# Altium footprint library con-molex.PCBLIB: 369 footprints (part 22 of 26)
Each footprint in its own frame and in the unit in brackets; x right, y up, seen from the top. Pads: shape width x height; smd on the part's side, far side on the other; paste and mask are expansions set on the pad; w line width, h text height; cw(c..) or ccw(c..) is an arc to the next point about the centre after c.
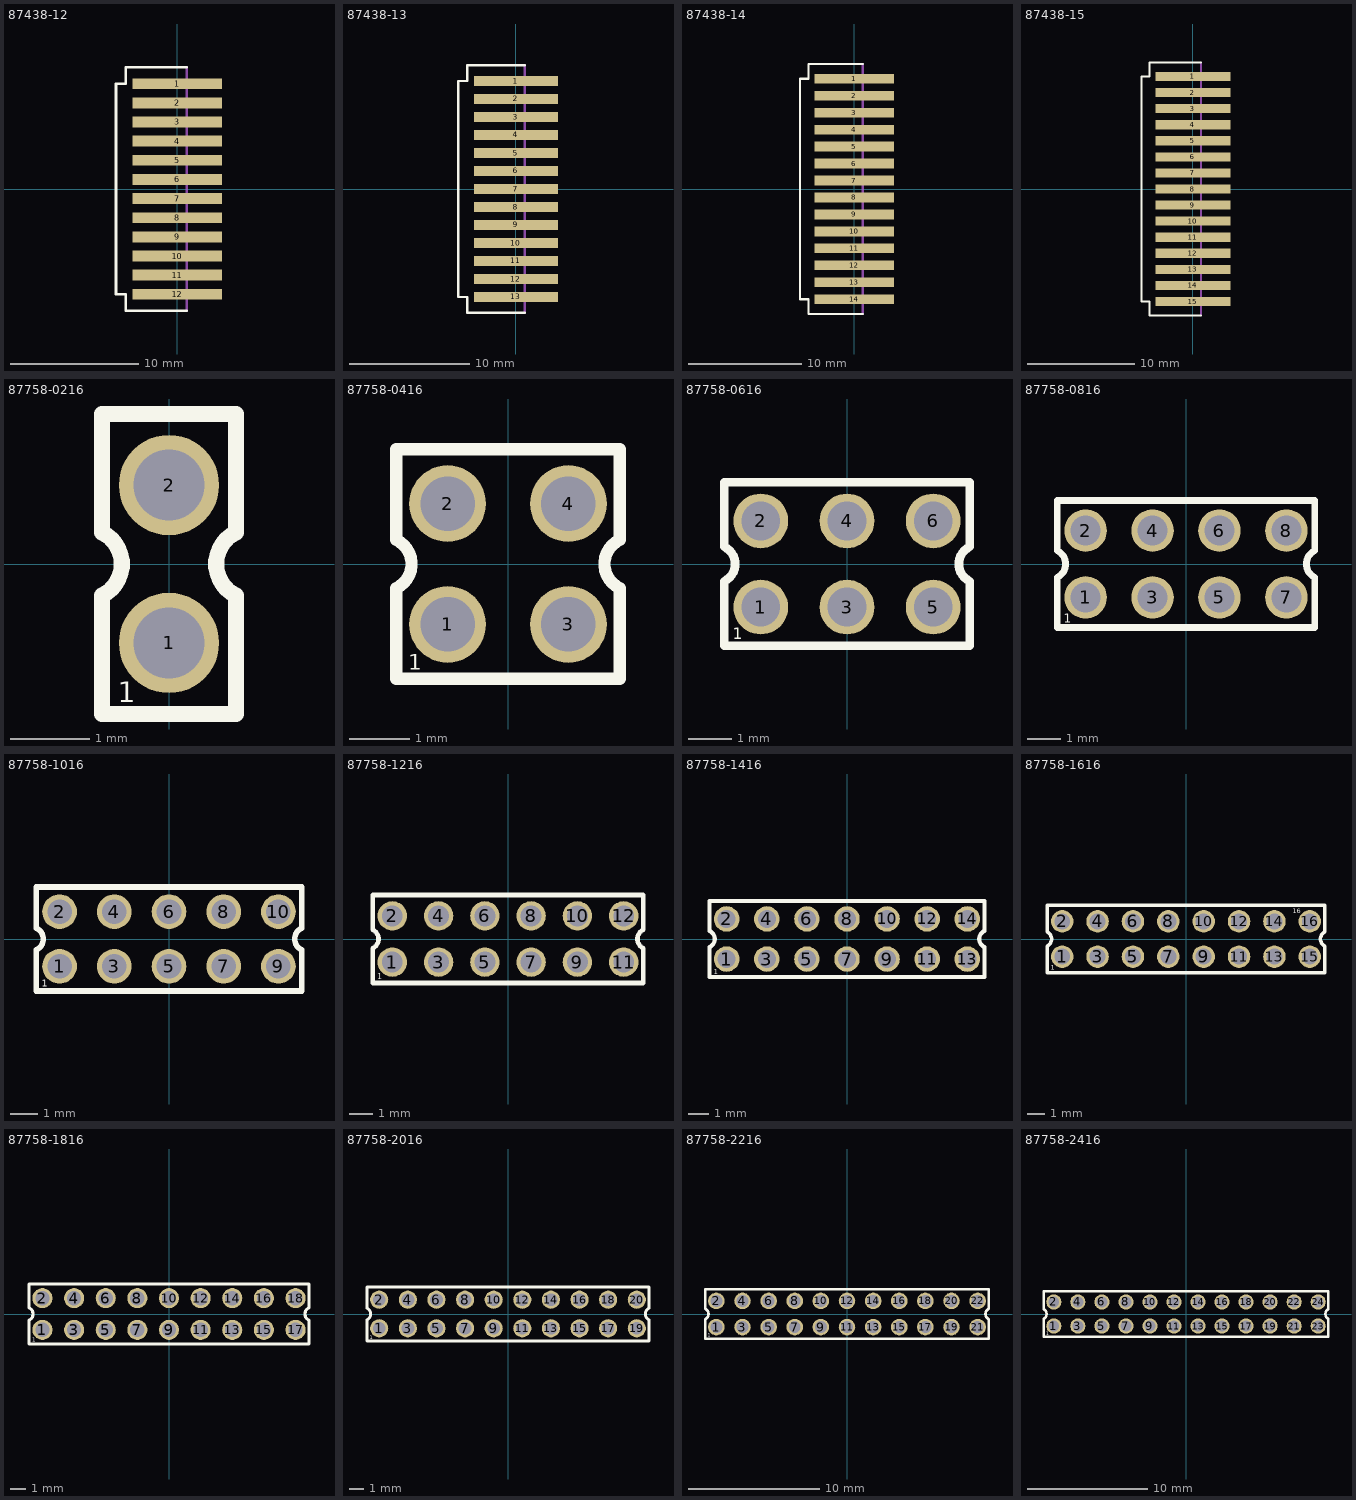
[diagram p21: the footprints below, top view; thin cyan lines are the x and y axes]

## 87438-12 [mm]
pads (12):
  rect 7x0.85 smd: 1(0,8.25) 2(0,6.75) 3(0,5.25) 4(0,3.75) 5(0,2.25) 6(0,0.75) 7(0,-0.75) 8(0,-2.25) 9(0,-3.75) 10(0,-5.25) 11(0,-6.75) 12(0,-8.25)
Top Overlay:
  lines w0.203: 0.75,-9.55 -4.05,-9.55 -4.05,-8.25 -4.8,-8.25 -4.8,8.25 -4.05,8.25 -4.05,9.55 0.75,9.55
Mechanical 16:
  rectangle: 0.8,8.025 2.85,8.475
  rectangle: 0.8,6.525 2.85,6.975
  rectangle: 0.8,5.025 2.85,5.475
  rectangle: 0.8,3.525 2.85,3.975
  rectangle: 0.8,2.025 2.85,2.475
  rectangle: 0.8,0.525 2.85,0.975
  rectangle: 0.8,-0.975 2.85,-0.525
  rectangle: 0.8,-2.475 2.85,-2.025
  rectangle: 0.8,-3.975 2.85,-3.525
  rectangle: 0.8,-5.475 2.85,-5.025
  rectangle: 0.8,-6.975 2.85,-6.525
  rectangle: 0.8,-8.475 2.85,-8.025
  lines w0.203: 0.75,-9.55 0.75,9.55

## 87438-13 [mm]
pads (13):
  rect 7x0.85 smd: 1(0,9) 2(0,7.5) 3(0,6) 4(0,4.5) 5(0,3) 6(0,1.5) 7(0,0) 8(0,-1.5) 9(0,-3) 10(0,-4.5) 11(0,-6) 12(0,-7.5) 13(0,-9)
Top Overlay:
  lines w0.203: 0.75,-10.3 -4.05,-10.3 -4.05,-9 -4.8,-9 -4.8,9 -4.05,9 -4.05,10.3 0.75,10.3
Mechanical 16:
  rectangle: 0.8,8.775 2.85,9.225
  rectangle: 0.8,7.275 2.85,7.725
  rectangle: 0.8,5.775 2.85,6.225
  rectangle: 0.8,4.275 2.85,4.725
  rectangle: 0.8,2.775 2.85,3.225
  rectangle: 0.8,1.275 2.85,1.725
  rectangle: 0.8,-0.225 2.85,0.225
  rectangle: 0.8,-1.725 2.85,-1.275
  rectangle: 0.8,-3.225 2.85,-2.775
  rectangle: 0.8,-4.725 2.85,-4.275
  rectangle: 0.8,-6.225 2.85,-5.775
  rectangle: 0.8,-7.725 2.85,-7.275
  rectangle: 0.8,-9.225 2.85,-8.775
  lines w0.203: 0.75,-10.3 0.75,10.3

## 87438-14 [mm]
pads (14):
  rect 7x0.85 smd: 1(0,9.75) 2(0,8.25) 3(0,6.75) 4(0,5.25) 5(0,3.75) 6(0,2.25) 7(0,0.75) 8(0,-0.75) 9(0,-2.25) 10(0,-3.75) 11(0,-5.25) 12(0,-6.75) 13(0,-8.25) 14(0,-9.75)
Top Overlay:
  lines w0.203: 0.75,-11.05 -4.05,-11.05 -4.05,-9.75 -4.8,-9.75 -4.8,9.75 -4.05,9.75 -4.05,11.05 0.75,11.05
Mechanical 16:
  rectangle: 0.8,9.525 2.85,9.975
  rectangle: 0.8,8.025 2.85,8.475
  rectangle: 0.8,6.525 2.85,6.975
  rectangle: 0.8,5.025 2.85,5.475
  rectangle: 0.8,3.525 2.85,3.975
  rectangle: 0.8,2.025 2.85,2.475
  rectangle: 0.8,0.525 2.85,0.975
  rectangle: 0.8,-0.975 2.85,-0.525
  rectangle: 0.8,-2.475 2.85,-2.025
  rectangle: 0.8,-3.975 2.85,-3.525
  rectangle: 0.8,-5.475 2.85,-5.025
  rectangle: 0.8,-6.975 2.85,-6.525
  rectangle: 0.8,-8.475 2.85,-8.025
  rectangle: 0.8,-9.975 2.85,-9.525
  lines w0.203: 0.75,-11.05 0.75,11.05

## 87438-15 [mm]
pads (15):
  rect 7x0.85 smd: 1(0,10.5) 2(0,9) 3(0,7.5) 4(0,6) 5(0,4.5) 6(0,3) 7(0,1.5) 8(0,0) 9(0,-1.5) 10(0,-3) 11(0,-4.5) 12(0,-6) 13(0,-7.5) 14(0,-9) 15(0,-10.5)
Top Overlay:
  lines w0.203: 0.75,-11.8 -4.05,-11.8 -4.05,-10.5 -4.8,-10.5 -4.8,10.5 -4.05,10.5 -4.05,11.8 0.75,11.8
Mechanical 16:
  rectangle: 0.8,10.275 2.85,10.725
  rectangle: 0.8,8.775 2.85,9.225
  rectangle: 0.8,7.275 2.85,7.725
  rectangle: 0.8,5.775 2.85,6.225
  rectangle: 0.8,4.275 2.85,4.725
  rectangle: 0.8,2.775 2.85,3.225
  rectangle: 0.8,1.275 2.85,1.725
  rectangle: 0.8,-0.225 2.85,0.225
  rectangle: 0.8,-1.725 2.85,-1.275
  rectangle: 0.8,-3.225 2.85,-2.775
  rectangle: 0.8,-4.725 2.85,-4.275
  rectangle: 0.8,-6.225 2.85,-5.775
  rectangle: 0.8,-7.725 2.85,-7.275
  rectangle: 0.8,-9.225 2.85,-8.775
  rectangle: 0.8,-10.725 2.85,-10.275
  lines w0.203: 0.75,-11.8 0.75,11.8

## 87758-0216 [mm]
pads (2):
  round 1.27 hole 0.9: 1(0,-1) 2(0,1)
Top Overlay:
  lines w0.203: -0.85,-1.9 0.85,-1.9 0.85,-0.4 cw(c1.04,0) 0.85,0.4 0.85,1.9 -0.85,1.9 -0.85,0.4 cw(c-1.04,0) -0.85,-0.4 -0.85,-1.9
  text "1" at -0.65,-1.75 h0.26
Mechanical 16:
  rectangle: -0.25,-1.25 0.25,-0.75
  rectangle: -0.25,0.75 0.25,1.25

## 87758-0416 [mm]
pads (4):
  round 1.27 hole 0.9: 1(-1,-1) 2(-1,1) 3(1,-1) 4(1,1)
Top Overlay:
  lines w0.203: -1.85,-1.9 1.85,-1.9 1.85,-0.4 cw(c2.04,0) 1.85,0.4 1.85,1.9 -1.85,1.9 -1.85,0.4 cw(c-2.04,0) -1.85,-0.4 -1.85,-1.9
  text "1" at -1.65,-1.75 h0.26
Mechanical 16:
  rectangle: -1.25,-1.25 -0.75,-0.75
  rectangle: -1.25,0.75 -0.75,1.25
  rectangle: 0.75,-1.25 1.25,-0.75
  rectangle: 0.75,0.75 1.25,1.25

## 87758-0616 [mm]
pads (6):
  round 1.27 hole 0.9: 1(-2,-1) 2(-2,1) 3(0,-1) 4(0,1) 5(2,-1) 6(2,1)
Top Overlay:
  lines w0.203: -2.85,-1.9 2.85,-1.9 2.85,-0.4 cw(c3.04,0) 2.85,0.4 2.85,1.9 -2.85,1.9 -2.85,0.4 cw(c-3.04,0) -2.85,-0.4 -2.85,-1.9
  text "1" at -2.65,-1.75 h0.26
Mechanical 16:
  rectangle: -2.25,-1.25 -1.75,-0.75
  rectangle: -2.25,0.75 -1.75,1.25
  rectangle: -0.25,-1.25 0.25,-0.75
  rectangle: -0.25,0.75 0.25,1.25
  rectangle: 1.75,-1.25 2.25,-0.75
  rectangle: 1.75,0.75 2.25,1.25

## 87758-0816 [mm]
pads (8):
  round 1.27 hole 0.9: 1(-3,-1) 2(-3,1) 3(-1,-1) 4(-1,1) 5(1,-1) 6(1,1) 7(3,-1) 8(3,1)
Top Overlay:
  lines w0.203: -3.85,-1.9 3.85,-1.9 3.85,-0.4 cw(c4.04,0) 3.85,0.4 3.85,1.9 -3.85,1.9 -3.85,0.4 cw(c-4.04,0) -3.85,-0.4 -3.85,-1.9
  text "1" at -3.65,-1.75 h0.26
Mechanical 16:
  rectangle: -3.25,-1.25 -2.75,-0.75
  rectangle: -3.25,0.75 -2.75,1.25
  rectangle: -1.25,-1.25 -0.75,-0.75
  rectangle: -1.25,0.75 -0.75,1.25
  rectangle: 0.75,-1.25 1.25,-0.75
  rectangle: 0.75,0.75 1.25,1.25
  rectangle: 2.75,-1.25 3.25,-0.75
  rectangle: 2.75,0.75 3.25,1.25

## 87758-1016 [mm]
pads (10):
  round 1.27 hole 0.9: 1(-4,-1) 2(-4,1) 3(-2,-1) 4(-2,1) 5(0,-1) 6(0,1) 7(2,-1) 8(2,1) 9(4,-1) 10(4,1)
Top Overlay:
  lines w0.203: -4.85,-1.9 4.85,-1.9 4.85,-0.4 cw(c5.04,0) 4.85,0.4 4.85,1.9 -4.85,1.9 -4.85,0.4 cw(c-5.04,0) -4.85,-0.4 -4.85,-1.9
  text "1" at -4.65,-1.75 h0.26
Mechanical 16:
  rectangle: -4.25,-1.25 -3.75,-0.75
  rectangle: -4.25,0.75 -3.75,1.25
  rectangle: -2.25,-1.25 -1.75,-0.75
  rectangle: -2.25,0.75 -1.75,1.25
  rectangle: -0.25,-1.25 0.25,-0.75
  rectangle: -0.25,0.75 0.25,1.25
  rectangle: 1.75,-1.25 2.25,-0.75
  rectangle: 1.75,0.75 2.25,1.25
  rectangle: 3.75,-1.25 4.25,-0.75
  rectangle: 3.75,0.75 4.25,1.25

## 87758-1216 [mm]
pads (12):
  round 1.27 hole 0.9: 1(-5,-1) 2(-5,1) 3(-3,-1) 4(-3,1) 5(-1,-1) 6(-1,1) 7(1,-1) 8(1,1) 9(3,-1) 10(3,1) 11(5,-1) 12(5,1)
Top Overlay:
  lines w0.203: -5.85,-1.9 5.85,-1.9 5.85,-0.4 cw(c6.04,0) 5.85,0.4 5.85,1.9 -5.85,1.9 -5.85,0.4 cw(c-6.04,0) -5.85,-0.4 -5.85,-1.9
  text "1" at -5.65,-1.75 h0.26
Mechanical 16:
  rectangle: -5.25,-1.25 -4.75,-0.75
  rectangle: -5.25,0.75 -4.75,1.25
  rectangle: -3.25,-1.25 -2.75,-0.75
  rectangle: -3.25,0.75 -2.75,1.25
  rectangle: -1.25,-1.25 -0.75,-0.75
  rectangle: -1.25,0.75 -0.75,1.25
  rectangle: 0.75,-1.25 1.25,-0.75
  rectangle: 0.75,0.75 1.25,1.25
  rectangle: 2.75,-1.25 3.25,-0.75
  rectangle: 2.75,0.75 3.25,1.25
  rectangle: 4.75,-1.25 5.25,-0.75
  rectangle: 4.75,0.75 5.25,1.25

## 87758-1416 [mm]
pads (14):
  round 1.27 hole 0.9: 1(-6,-1) 2(-6,1) 3(-4,-1) 4(-4,1) 5(-2,-1) 6(-2,1) 7(0,-1) 8(0,1) 9(2,-1) 10(2,1) 11(4,-1) 12(4,1) 13(6,-1) 14(6,1)
Top Overlay:
  lines w0.203: -6.85,-1.9 6.85,-1.9 6.85,-0.4 cw(c7.04,0) 6.85,0.4 6.85,1.9 -6.85,1.9 -6.85,0.4 cw(c-7.04,0) -6.85,-0.4 -6.85,-1.9
  text "1" at -6.65,-1.75 h0.26
Mechanical 16:
  rectangle: -6.25,-1.25 -5.75,-0.75
  rectangle: -6.25,0.75 -5.75,1.25
  rectangle: -4.25,-1.25 -3.75,-0.75
  rectangle: -4.25,0.75 -3.75,1.25
  rectangle: -2.25,-1.25 -1.75,-0.75
  rectangle: -2.25,0.75 -1.75,1.25
  rectangle: -0.25,-1.25 0.25,-0.75
  rectangle: -0.25,0.75 0.25,1.25
  rectangle: 1.75,-1.25 2.25,-0.75
  rectangle: 1.75,0.75 2.25,1.25
  rectangle: 3.75,-1.25 4.25,-0.75
  rectangle: 3.75,0.75 4.25,1.25
  rectangle: 5.75,-1.25 6.25,-0.75
  rectangle: 5.75,0.75 6.25,1.25

## 87758-1616 [mm]
pads (16):
  round 1.27 hole 0.9: 1(-7,-1) 2(-7,1) 3(-5,-1) 4(-5,1) 5(-3,-1) 6(-3,1) 7(-1,-1) 8(-1,1) 9(1,-1) 10(1,1) 11(3,-1) 12(3,1) 13(5,-1) 14(5,1) 15(7,-1) 16(7,1)
Top Overlay:
  lines w0.203: -7.85,-1.9 7.85,-1.9 7.85,-0.4 cw(c8.04,0) 7.85,0.4 7.85,1.9 -7.85,1.9 -7.85,0.4 cw(c-8.04,0) -7.85,-0.4 -7.85,-1.9
  text "1" at -7.65,-1.75 h0.26
  text "16" at 6.025,1.45 h0.26
Mechanical 16:
  rectangle: -7.25,-1.25 -6.75,-0.75
  rectangle: -7.25,0.75 -6.75,1.25
  rectangle: -5.25,-1.25 -4.75,-0.75
  rectangle: -5.25,0.75 -4.75,1.25
  rectangle: -3.25,-1.25 -2.75,-0.75
  rectangle: -3.25,0.75 -2.75,1.25
  rectangle: -1.25,-1.25 -0.75,-0.75
  rectangle: -1.25,0.75 -0.75,1.25
  rectangle: 0.75,-1.25 1.25,-0.75
  rectangle: 0.75,0.75 1.25,1.25
  rectangle: 2.75,-1.25 3.25,-0.75
  rectangle: 2.75,0.75 3.25,1.25
  rectangle: 4.75,-1.25 5.25,-0.75
  rectangle: 4.75,0.75 5.25,1.25
  rectangle: 6.75,-1.25 7.25,-0.75
  rectangle: 6.75,0.75 7.25,1.25

## 87758-1816 [mm]
pads (18):
  round 1.27 hole 0.9: 1(-8,-1) 2(-8,1) 3(-6,-1) 4(-6,1) 5(-4,-1) 6(-4,1) 7(-2,-1) 8(-2,1) 9(0,-1) 10(0,1) 11(2,-1) 12(2,1) 13(4,-1) 14(4,1) 15(6,-1) 16(6,1) 17(8,-1) 18(8,1)
Top Overlay:
  lines w0.203: -8.85,-1.9 8.85,-1.9 8.85,-0.4 cw(c9.04,0) 8.85,0.4 8.85,1.9 -8.85,1.9 -8.85,0.4 cw(c-9.04,0) -8.85,-0.4 -8.85,-1.9
  text "1" at -8.65,-1.75 h0.26
Mechanical 16:
  rectangle: -8.25,-1.25 -7.75,-0.75
  rectangle: -8.25,0.75 -7.75,1.25
  rectangle: -6.25,-1.25 -5.75,-0.75
  rectangle: -6.25,0.75 -5.75,1.25
  rectangle: -4.25,-1.25 -3.75,-0.75
  rectangle: -4.25,0.75 -3.75,1.25
  rectangle: -2.25,-1.25 -1.75,-0.75
  rectangle: -2.25,0.75 -1.75,1.25
  rectangle: -0.25,-1.25 0.25,-0.75
  rectangle: -0.25,0.75 0.25,1.25
  rectangle: 1.75,-1.25 2.25,-0.75
  rectangle: 1.75,0.75 2.25,1.25
  rectangle: 3.75,-1.25 4.25,-0.75
  rectangle: 3.75,0.75 4.25,1.25
  rectangle: 5.75,-1.25 6.25,-0.75
  rectangle: 5.75,0.75 6.25,1.25
  rectangle: 7.75,-1.25 8.25,-0.75
  rectangle: 7.75,0.75 8.25,1.25

## 87758-2016 [mm]
pads (20):
  round 1.27 hole 0.9: 1(-9,-1) 2(-9,1) 3(-7,-1) 4(-7,1) 5(-5,-1) 6(-5,1) 7(-3,-1) 8(-3,1) 9(-1,-1) 10(-1,1) 11(1,-1) 12(1,1) 13(3,-1) 14(3,1) 15(5,-1) 16(5,1) 17(7,-1) 18(7,1) 19(9,-1) 20(9,1)
Top Overlay:
  lines w0.203: -9.85,-1.9 9.85,-1.9 9.85,-0.4 cw(c10.04,0) 9.85,0.4 9.85,1.9 -9.85,1.9 -9.85,0.4 cw(c-10.04,0) -9.85,-0.4 -9.85,-1.9
  text "1" at -9.65,-1.75 h0.26
Mechanical 16:
  rectangle: -9.25,-1.25 -8.75,-0.75
  rectangle: -9.25,0.75 -8.75,1.25
  rectangle: -7.25,-1.25 -6.75,-0.75
  rectangle: -7.25,0.75 -6.75,1.25
  rectangle: -5.25,-1.25 -4.75,-0.75
  rectangle: -5.25,0.75 -4.75,1.25
  rectangle: -3.25,-1.25 -2.75,-0.75
  rectangle: -3.25,0.75 -2.75,1.25
  rectangle: -1.25,-1.25 -0.75,-0.75
  rectangle: -1.25,0.75 -0.75,1.25
  rectangle: 0.75,-1.25 1.25,-0.75
  rectangle: 0.75,0.75 1.25,1.25
  rectangle: 2.75,-1.25 3.25,-0.75
  rectangle: 2.75,0.75 3.25,1.25
  rectangle: 4.75,-1.25 5.25,-0.75
  rectangle: 4.75,0.75 5.25,1.25
  rectangle: 6.75,-1.25 7.25,-0.75
  rectangle: 6.75,0.75 7.25,1.25
  rectangle: 8.75,-1.25 9.25,-0.75
  rectangle: 8.75,0.75 9.25,1.25

## 87758-2216 [mm]
pads (22):
  round 1.27 hole 0.9: 1(-10,-1) 2(-10,1) 3(-8,-1) 4(-8,1) 5(-6,-1) 6(-6,1) 7(-4,-1) 8(-4,1) 9(-2,-1) 10(-2,1) 11(0,-1) 12(0,1) 13(2,-1) 14(2,1) 15(4,-1) 16(4,1) 17(6,-1) 18(6,1) 19(8,-1) 20(8,1) 21(10,-1) 22(10,1)
Top Overlay:
  lines w0.203: -10.85,-1.9 10.85,-1.9 10.85,-0.4 cw(c11.04,0) 10.85,0.4 10.85,1.9 -10.85,1.9 -10.85,0.4 cw(c-11.04,0) -10.85,-0.4 -10.85,-1.9
  text "1" at -10.65,-1.75 h0.26
Mechanical 16:
  rectangle: -10.25,-1.25 -9.75,-0.75
  rectangle: -10.25,0.75 -9.75,1.25
  rectangle: -8.25,-1.25 -7.75,-0.75
  rectangle: -8.25,0.75 -7.75,1.25
  rectangle: -6.25,-1.25 -5.75,-0.75
  rectangle: -6.25,0.75 -5.75,1.25
  rectangle: -4.25,-1.25 -3.75,-0.75
  rectangle: -4.25,0.75 -3.75,1.25
  rectangle: -2.25,-1.25 -1.75,-0.75
  rectangle: -2.25,0.75 -1.75,1.25
  rectangle: -0.25,-1.25 0.25,-0.75
  rectangle: -0.25,0.75 0.25,1.25
  rectangle: 1.75,-1.25 2.25,-0.75
  rectangle: 1.75,0.75 2.25,1.25
  rectangle: 3.75,-1.25 4.25,-0.75
  rectangle: 3.75,0.75 4.25,1.25
  rectangle: 5.75,-1.25 6.25,-0.75
  rectangle: 5.75,0.75 6.25,1.25
  rectangle: 7.75,-1.25 8.25,-0.75
  rectangle: 7.75,0.75 8.25,1.25
  rectangle: 9.75,-1.25 10.25,-0.75
  rectangle: 9.75,0.75 10.25,1.25

## 87758-2416 [mm]
pads (24):
  round 1.27 hole 0.9: 1(-11,-1) 2(-11,1) 3(-9,-1) 4(-9,1) 5(-7,-1) 6(-7,1) 7(-5,-1) 8(-5,1) 9(-3,-1) 10(-3,1) 11(-1,-1) 12(-1,1) 13(1,-1) 14(1,1) 15(3,-1) 16(3,1) 17(5,-1) 18(5,1) 19(7,-1) 20(7,1) 21(9,-1) 22(9,1) 23(11,-1) 24(11,1)
Top Overlay:
  lines w0.203: -11.85,-1.9 11.85,-1.9 11.85,-0.4 cw(c12.04,0) 11.85,0.4 11.85,1.9 -11.85,1.9 -11.85,0.4 cw(c-12.04,0) -11.85,-0.4 -11.85,-1.9
  text "1" at -11.65,-1.75 h0.26
Mechanical 16:
  rectangle: -11.25,-1.25 -10.75,-0.75
  rectangle: -11.25,0.75 -10.75,1.25
  rectangle: -9.25,-1.25 -8.75,-0.75
  rectangle: -9.25,0.75 -8.75,1.25
  rectangle: -7.25,-1.25 -6.75,-0.75
  rectangle: -7.25,0.75 -6.75,1.25
  rectangle: -5.25,-1.25 -4.75,-0.75
  rectangle: -5.25,0.75 -4.75,1.25
  rectangle: -3.25,-1.25 -2.75,-0.75
  rectangle: -3.25,0.75 -2.75,1.25
  rectangle: -1.25,-1.25 -0.75,-0.75
  rectangle: -1.25,0.75 -0.75,1.25
  rectangle: 0.75,-1.25 1.25,-0.75
  rectangle: 0.75,0.75 1.25,1.25
  rectangle: 2.75,-1.25 3.25,-0.75
  rectangle: 2.75,0.75 3.25,1.25
  rectangle: 4.75,-1.25 5.25,-0.75
  rectangle: 4.75,0.75 5.25,1.25
  rectangle: 6.75,-1.25 7.25,-0.75
  rectangle: 6.75,0.75 7.25,1.25
  rectangle: 8.75,-1.25 9.25,-0.75
  rectangle: 8.75,0.75 9.25,1.25
  rectangle: 10.75,-1.25 11.25,-0.75
  rectangle: 10.75,0.75 11.25,1.25